# Altium footprint library 14-Inductors.PcbLib: 164 footprints (part 1 of 11)
Each footprint in its own frame and in the unit in brackets; x right, y up, seen from the top. Pads: shape width x height; smd on the part's side, far side on the other; paste and mask are expansions set on the pad; w line width, h text height; cw(c..) or ccw(c..) is an arc to the next point about the centre after c.
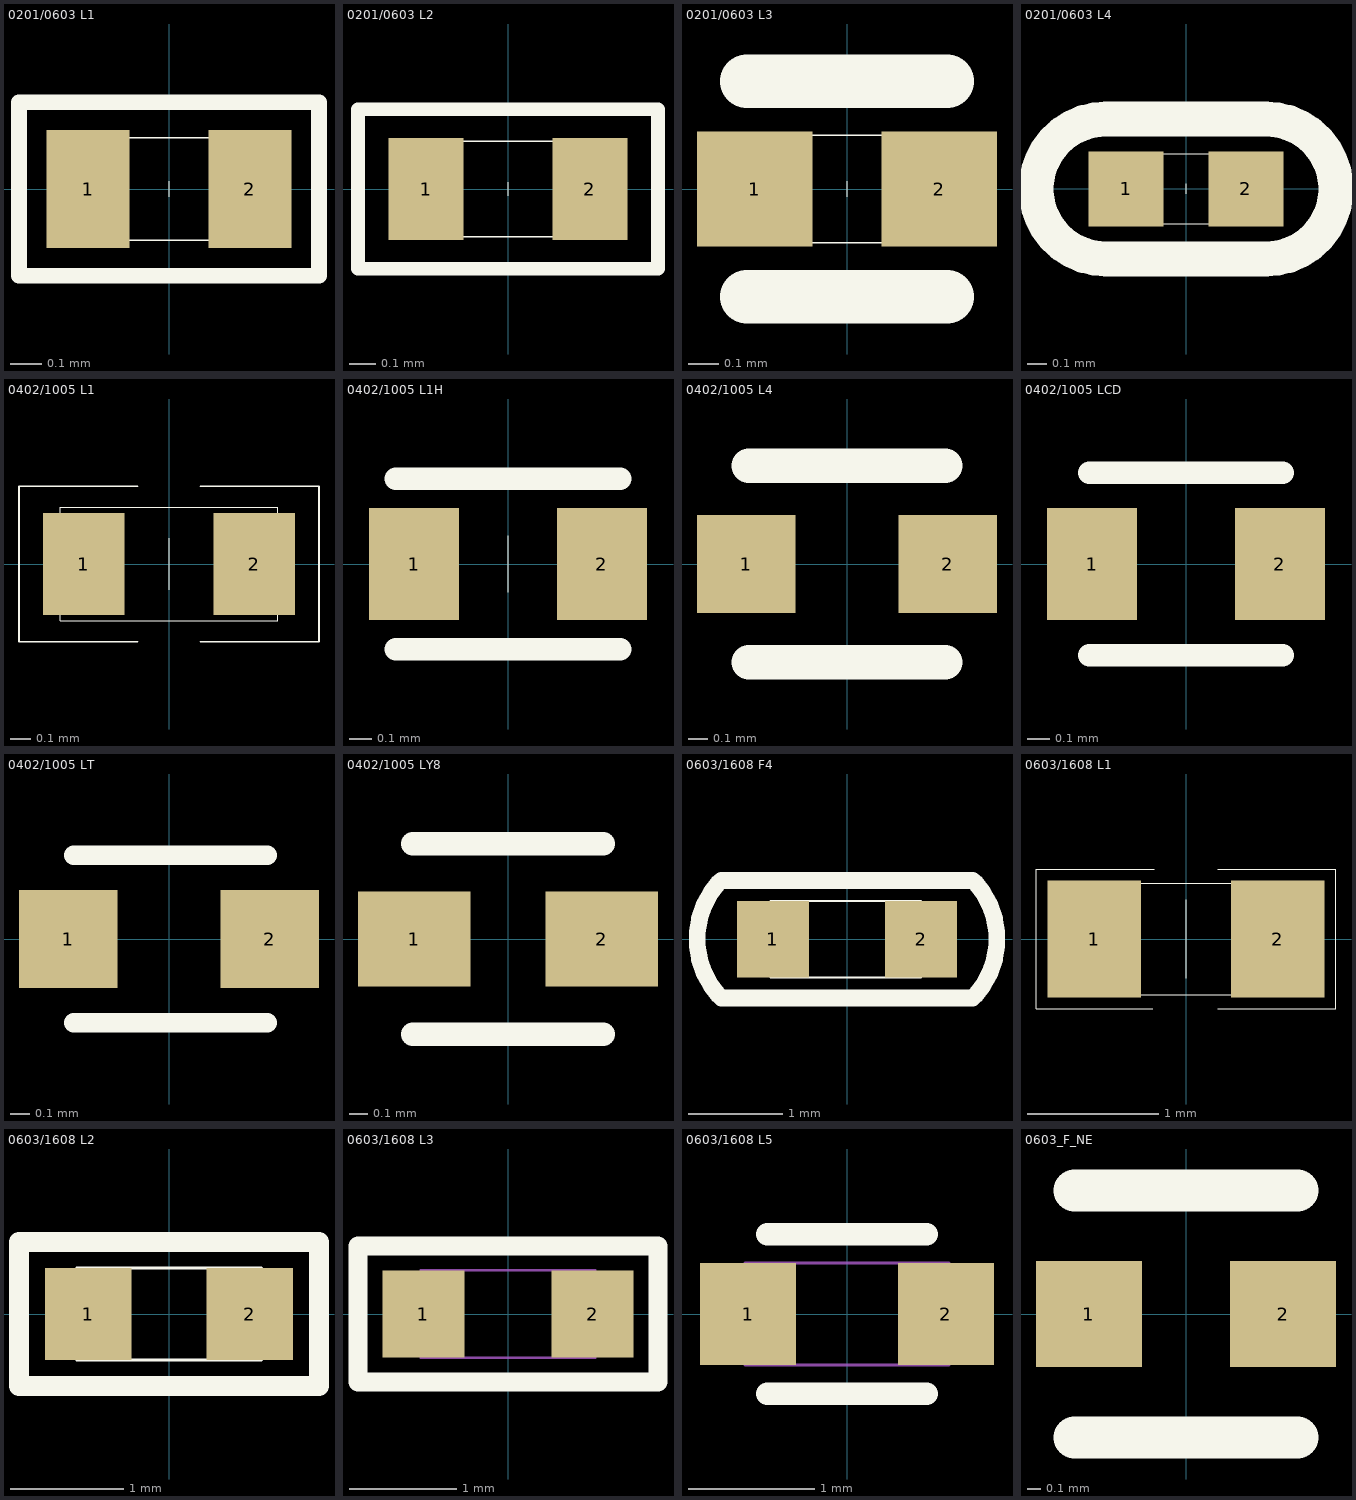
[diagram p0: the footprints below, top view; thin cyan lines are the x and y axes]

## 0201/0603 L1 [mil]
height 31.5
pads (2):
  rect 10.5x15 smd mask+2.76: 1(-10.24,0)
  rect 10.5x15 smd mask+2: 2(10.24,0)
Top Overlay:
  lines w0.1: 0,-1 0,1 ; 0,-1 0,1 ; 0,-1 0,1
  lines w0.2: -13,-6.5 -13,6.5 13,6.5 13,-6.5 -13,-6.5
  lines w2: -19,-11 -19,11 19,11 19,-11 -19,-11
3D body "0201-ll.stp": height 11.81, standoff 0, extent -11.81,-6 11.81,5.81
3D body "0_381-0_267-0201.stp": height 0.79, standoff 0, extent -15.5,-7.5 -4.99,7.5
3D body "0_381-0_267-0201.stp": height 0.79, standoff 0, extent 4.99,-7.51 15.5,7.49

## 0201/0603 L2 [mil]
height 31.5
pads (2):
  rect 11x15 smd mask+2.76: 1(-12,0)
  rect 11x15 smd mask+2: 2(12,0)
Top Overlay:
  lines w0.1: 0,-1 0,1
  lines w0.2: -13,-7 13,-7 13,7 -13,7 -13,-7
  lines w2: -22,-11.7 22,-11.7 22,11.7 -22,11.7 -22,-11.7
3D body "0_381-0_267-0201.stp": height 0.79, standoff 0, extent 6.99,-7.51 17.5,7.49
3D body "0_381-0_267-0201.stp": height 0.79, standoff 0, extent -17.51,-7.51 -7,7.49
3D body "0201-c.stp": height 11.41, standoff -0.41, extent -11.81,-6 11.81,5.81

## 0201/0603 L3 [mil]
height 31.5
pads (2):
  rect 15x15 smd mask+2.76: 1(-12,0)
  rect 15x15 smd mask+2: 2(12,0)
Top Overlay:
  lines w0.1: 0,-1 0,1
  lines w0.2: -13,-7 13,-7 13,7 -13,7 -13,-7
  lines w7: -13,-14 13,-14 ; -13,14 13,14
3D body "0_381-0_381-0201a.stp": height 0.79, standoff 0, extent 4.5,-7.51 19.5,7.49
3D body "0_381-0_381-0201a.stp": height 0.79, standoff 0, extent -19.5,-7.5 -4.5,7.5
3D body "0201-l.stp": height 11.81, standoff 0, extent -12,-6 11.62,5.81

## 0201/0603 L4 [mil]
height 31.5
pads (2):
  rect 15x15 smd mask+2: 1(-12,0)
  rect 15x15 smd mask+2.76: 2(12,0)
Top Overlay:
  lines w0.1: 0,-1 0,1
  lines w0.2: -13,-7 -13,7 13,7 13,-7 -13,-7
  lines w7: -16,-14 16,-14 ; -16,14 16,14
  lines w7.01: -16,-14.03 cw(c-16,-0.02) -16,14 ; 16,-14.03 ccw(c16,-0.02) 16,14
3D body "0_381-0_381-0201a.stp": height 0.79, standoff 0, extent -19.5,-7.5 -4.5,7.5
3D body "0_381-0_381-0201a.stp": height 0.79, standoff 0, extent 4.5,-7.5 19.5,7.5
3D body "0201-l.stp": height 11.81, standoff 0, extent -12,-6 11.62,5.81

## 0402/1005 L1 [mm]
height 0.8
pads (2):
  rect 0.4x0.5 smd mask+0.07: 1(-0.419,0)
  rect 0.4x0.5 smd mask+0.051: 2(0.419,0)
Top Overlay:
  lines w0.001: 0.499,0.25 0.499,0.25
  lines w0.003: 0,-0.127 0,0.127
  lines w0.005: -0.533,-0.279 0.533,-0.279 0.533,0.279 -0.533,0.279 -0.533,-0.279
  lines w0.008: -0.152,-0.381 -0.737,-0.381 -0.737,0.381 -0.152,0.381 ; 0.152,-0.381 0.737,-0.381 0.737,0.381 0.152,0.381
3D body "0402-l.stp": height 0.5, standoff 0, extent -0.5,-0.254 0.5,0.246
3D body "0_4-0_5-0402.stp": height 0.02, standoff 0, extent -0.619,-0.25 -0.219,0.25
3D body "0_4-0_5-0402.stp": height 0.02, standoff 0, extent 0.222,-0.246 0.622,0.254

## 0402/1005 L1H [mm]
height 0.8
pads (2):
  rect 0.4x0.5 smd mask+0.051: 1(-0.419,0)
  rect 0.4x0.5 smd mask+0.07: 2(0.419,0)
Top Overlay:
  lines w0.003: 0,-0.127 0,0.127
  lines w0.1: -0.5,-0.381 0.5,-0.381 ; -0.5,0.381 0.5,0.381
3D body "0402-l.stp": height 0.5, standoff 0, extent -0.5,-0.254 0.5,0.246
3D body "0_4-0_5-0402.stp": height 0.02, standoff 0, extent -0.619,-0.25 -0.219,0.25
3D body "0_4-0_5-0402.stp": height 0.02, standoff 0, extent 0.222,-0.246 0.622,0.254

## 0402/1005 L4 [mil]
height 31.5
pads (2):
  rect 20x20 smd mask+2.76: 1(-20.5,0)
  rect 20x20 smd: 2(20.5,0)
Top Overlay:
  lines w7: -20,-20 20,-20 ; -20,20 20,20
3D body "0402-l.stp": height 19.68, standoff 0, extent -19.68,-10 19.69,9.69
3D body "0_508-0_508-0402-3.stp": height 0.79, standoff 0, extent -30.5,-10 -10.5,10
3D body "0_508-0_508-0402-3.stp": height 0.79, standoff 0, extent 10.5,-10 30.5,10

## 0402/1005 LCD [mm]
height 0.8
pads (2):
  rect 0.4x0.5 smd mask+0.051: 1(-0.419,0) 2(0.419,0)
Top Overlay:
  lines w0.1: -0.432,-0.406 0.432,-0.406 ; -0.432,0.406 0.432,0.406
3D body "0402-l.stp": height 0.5, standoff 0, extent -0.5,-0.254 0.5,0.246
3D body "0_4-0_5-0402.stp": height 0.02, standoff 0, extent 0.222,-0.246 0.622,0.254
3D body "0_4-0_5-0402.stp": height 0.02, standoff 0, extent -0.622,-0.246 -0.222,0.254

## 0402/1005 LT [mil]
height 31.5
pads (2):
  rect 20x20 smd mask+2.76: 1(-20.5,0) 2(20.5,0)
Top Overlay:
  lines w3.94: -19.37,-17 20,-17 ; -19.37,17 20,17
3D body "0402-l.stp": height 19.68, standoff 0, extent -19.68,-10 19.69,9.69
3D body "0_508-0_508-0402-3.stp": height 0.79, standoff 0, extent -30.49,-9.99 -10.49,10.01
3D body "0_508-0_508-0402-3.stp": height 0.79, standoff 0, extent 10.51,-9.99 30.51,10.01

## 0402/1005 LY8 [mm]
height 0.8
pads (2):
  rect 0.6x0.508 smd mask+0.07: 1(-0.5,0) 2(0.5,0)
Top Overlay:
  lines w0.127: -0.508,-0.508 0.508,-0.508 ; -0.508,0.508 0.508,0.508
3D body "0402-l.stp": height 0.5, standoff 0, extent -0.5,-0.254 0.5,0.246
3D body "0_508-0_508-0402-3.stp": height 0.02, standoff 0, extent -0.787,-0.254 -0.279,0.254
3D body "0_508-0_508-0402-3.stp": height 0.02, standoff 0, extent 0.28,-0.254 0.788,0.254

## 0603/1608 F4 [mil]
height 360.24
pads (2):
  rect 30x32 smd: 1(-31,0)
  rect 30x32 smd mask+2.76: 2(31,0)
Top Overlay:
  lines w0.98: -32,-16 31,-16 31,16 -32,16 -32,-16
  lines w7: -52.5,-24.61 52.5,-24.61 ; -52.5,24.61 52.5,24.61
  lines w7.01: -53.51,-23.77 cw(c-27.44,0.11) -53.51,24 ; 53.5,-23.77 ccw(c27.43,0.11) 53.5,24
Bottom Overlay:
3D body "0603-l.stp": height 31.5, standoff 0, extent -31.99,-15.74 31,15.75
3D body "0_8128-0_762-0603.stp": height 0.79, standoff 0, extent 16,-16 46,16
3D body "0_8128-0_762-0603.stp": height 0.79, standoff 0, extent -46,-16 -16,16

## 0603/1608 L1 [mil]
height 31.5
pads (2):
  rect 28x35 smd mask+2: 1(-27.56,0)
  rect 28x35 smd mask+2.76: 2(27.56,0)
Top Overlay:
  lines w0.1: 0,-11.81 0,11.81
  lines w0.2: -10,-21 -45,-21 -45,21 -9.57,21 ; 9.57,-21 45,-21 45,21 9.57,21 ; -33,-16.73 -33,16.73 33,16.73 33,-16.73 -33,-16.73
3D body "0_8128-0_762-0603.stp": height 0.79, standoff 0, extent 13.5,-16 43.5,16
3D body "0_8128-0_762-0603.stp": height 0.79, standoff 0, extent -41.5,-16 -11.5,16
3D body "0603-l.stp": height 31.5, standoff 0, extent -32,-16 30.99,15.5

## 0603/1608 L2 [mil]
height 31.5
pads (2):
  rect 30x32 smd mask+2.76: 1(-28,0)
  rect 30x32 smd: 2(28,0)
Top Overlay:
  lines w1: -32,-16 32,-16 32,16 -32,16 -32,-16
  lines w7: -52,-25 -52,25 52,25 52,-25 -52,-25
3D body "0_8128-0_762-0603.stp": height 0.79, standoff 0, extent 13,-16 43,16
3D body "0_8128-0_762-0603.stp": height 0.79, standoff 0, extent -43,-16 -13,16
3D body "0603-l.stp": height 31.5, standoff 0, extent -32,-16 30.99,15.5

## 0603/1608 L3 [mil]
height 31.5
pads (2):
  rect 30x32 smd: 1(-31,0) 2(31,0)
Top Overlay:
  lines w7: -55,-25 -55,25 55,25 55,-25 -55,-25
Mechanical 15:
  lines w1: -32,-16 -32,16 32,16 32,-16 -32,-16
3D body "0603-l.stp": height 31.5, standoff 0, extent -32,-16 30.99,15.5
3D body "0_8128-0_762-0603.stp": height 0.79, standoff 0, extent -46,-16 -16,16
3D body "0_8128-0_762-0603.stp": height 0.79, standoff 0, extent 16,-16 46,16

## 0603/1608 L5 [mil]
height 31.5
pads (2):
  rect 30x32 smd: 1(-31,0) 2(31,0)
Top Overlay:
  lines w7: -25,-25 25,-25 ; -25,25 25,25
Mechanical 15:
  lines w1: -32,-16 32,-16 32,16 -32,16 -32,-16
3D body "0_8128-0_762-0603.stp": height 0.79, standoff 0, extent 16,-16 46,16
3D body "0_8128-0_762-0603.stp": height 0.79, standoff 0, extent -46,-16 -16,16
3D body "0603-l.stp": height 31.5, standoff 0, extent -32,-16 30.99,15.5

## 0603_F_NE [mil]
height 31.5
pads (2):
  rect 30x30 smd: 1(-27.5,0)
  rect 30x30 smd mask+2.76: 2(27.5,0)
Top Overlay:
  lines w12: -31.5,-35 31.5,-35 ; -31.5,35 31.5,35
3D body "0_762-0_762.stp": height 0.79, standoff 0, extent 12.5,-15 42.5,15
3D body "0_762-0_762.stp": height 0.79, standoff 0, extent -42.5,-15 -12.5,15
3D body "0603-vrt.stp": height 31.5, standoff 0, extent -31.5,-15.75 31.5,15.75